# Altium footprint library Miscellaneous Connectors.PcbLib: 248 footprints (part 3 of 16)
Each footprint in its own frame and in the unit in brackets; x right, y up, seen from the top. Pads: shape width x height; smd on the part's side, far side on the other; paste and mask are expansions set on the pad; w line width, h text height; cw(c..) or ccw(c..) is an arc to the next point about the centre after c.
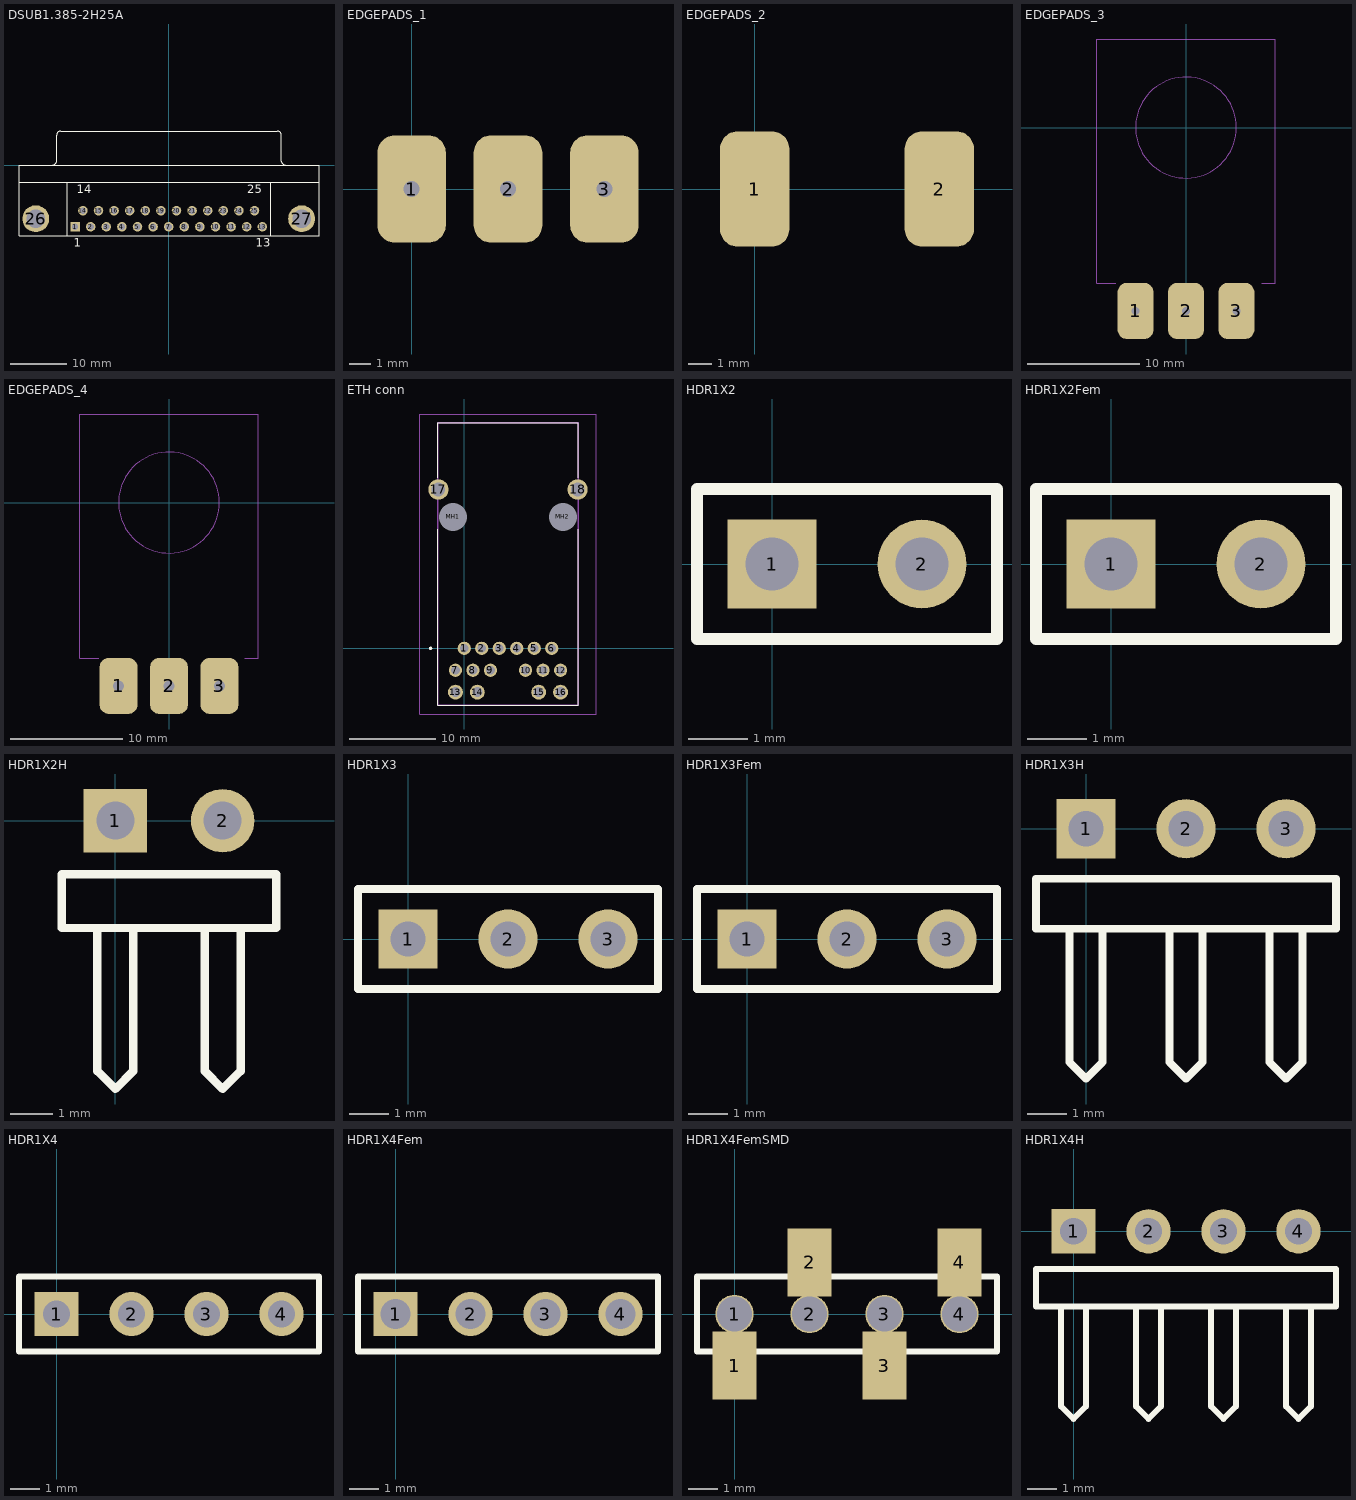
[diagram p2: the footprints below, top view; thin cyan lines are the x and y axes]

## DSUB1.385-2H25A [mm] "Connector; D Subminiature; 25 Position; Right Angle; Pitch 1.385 mm"
height 12.93
pads (27):
  rect 1.69x1.69 hole 1.09: 1(-16.566,-10.92)
  round 1.69 hole 1.09: 2(-13.805,-10.92) 3(-11.044,-10.92) 4(-8.283,-10.92) 5(-5.522,-10.92) 6(-2.761,-10.92) 7(0,-10.92) 8(2.761,-10.92) 9(5.522,-10.92) 10(8.283,-10.92) 11(11.044,-10.92) 12(13.805,-10.92) 13(16.566,-10.92) 14(-15.185,-8.08) 15(-12.424,-8.08) 16(-9.663,-8.08) 17(-6.902,-8.08) 18(-4.141,-8.08) 19(-1.38,-8.08) 20(1.381,-8.08) 21(4.142,-8.08) 22(6.903,-8.08) 23(9.664,-8.08) 24(12.425,-8.08) 25(15.186,-8.08)
  round 4.76 hole 3.26: 26(-23.526,-9.5) 27(23.526,-9.5)
Top Overlay:
  lines w0.2: -26.496,-3 26.604,-3 ; -20.541,0.005 ccw(c-20.541,0.7) -19.846,0.7 -19.846,5.3 ; -19.841,5.305 cw(c-19.146,5.305) -19.146,6 19.254,6 cw(c19.254,5.305) 19.949,5.305 ; -17.946,-12.5 -17.946,-3 ; 18.054,-12.5 18.054,-3 ; 19.954,5.3 19.954,0.7 ccw(c20.649,0.7) 20.649,0.005 ; -26.496,-12.5 -26.496,0 26.604,0 26.604,-12.5 -26.496,-12.5
  text "25" at 13.936,-4.975 h1.5
  text "14" at -16.31,-4.975 h1.5
  text "13" at 15.441,-14.475 h1.5
  text "1" at -16.816,-14.475 h1.5

## EDGEPADS_1 [mm] "Dim: 3x5. separacion: 5mm. Cantidad: 3"
pads (3):
  rrect50% 3.2x5 hole 0.75 square: 1(0,0) 2(4.5,0) 3(9,0)
3D body "pot 282TCCS104B25B3.STEP": height 23.23, standoff -5.57, extent -3.431,-25.9 12.469,2.7

## EDGEPADS_2 [mm] "Dim: 3x5. separacion: 8mm. Cantidad: 2"
pads (2):
  rrect50% 3x5 smd: 1(0,0) 2(8,0)

## EDGEPADS_3 [mm] "Dim: 3x5. separacion: 5mm. Cantidad: 3"
pads (3):
  rrect50% 3.2x5 hole 0.75 square: 1(-4.5,-16.35) 2(0,-16.35) 3(4.5,-16.35)
Mechanical 15:
  circle w0.1: c0,0 r4.5
  lines w0.1: -6.275,-13.9 -7.95,-13.9 -7.95,7.9 7.95,7.9 7.95,-13.9 6.75,-13.9
3D body "pot 282SCCF104B25A1.STEP": height 29.14, standoff -1.91, extent -11.4,-16.55 7.95,8.17

## EDGEPADS_4 [mm] "Dim: 3x5. separacion: 5mm. Cantidad: 3"
pads (3):
  rrect50% 3.4x5 hole 1 square: 1(-4.5,-16.35) 2(0,-16.35) 3(4.5,-16.35)
Mechanical 15:
  circle w0.1: c0,0 r4.5
  lines w0.1: -6.275,-13.9 -7.95,-13.9 -7.95,7.9 7.95,7.9 7.95,-13.9 6.75,-13.9
3D body "pot 282SAAF103A25B3.STEP": height 18.75, standoff -1.92, extent -7.95,-16.5 7.95,8.22

## ETH conn [mm]
pads (20):
  round 1.53 hole 1.02: 1(0,0) 2(2.03,0) 3(4.06,0) 4(6.09,0) 5(8.12,0) 6(10.15,0) 7(-1.015,-2.54) 8(1.015,-2.54) 9(3.045,-2.54) 10(7.105,-2.54) 11(9.135,-2.54) 12(11.165,-2.54)
  round 1.725 hole 1.15: 13(-1.02,-5.08) 14(1.52,-5.08) 15(8.63,-5.08) 16(11.17,-5.08)
  round 2.355 hole 1.57: 17(-2.99,18.41) 18(13.14,18.41)
  round 1.625 hole 3.25 unplated: MH1(-1.275,15.24) MH2(11.425,15.24)
Top Overlay:
  lines w0.1: -3.08,13.78 -3.08,-6.61 13.075,-6.61 13.23,-6.61 13.23,13.78 ; -3.08,19.78 -3.08,26.16 13.23,26.16 13.23,19.78
  lines w0.2: -3.9,-0.1 ccw(c-3.9,0) -3.9,0.1 ccw(c-3.9,0) -3.9,-0.1
Mechanical 13:
  lines w0.2: -3.08,-6.61 -3.08,26.16 13.23,26.16 13.23,-6.61 -3.08,-6.61
Mechanical 15:
  lines w0.1: -5.168,-7.61 -5.168,27.16 15.317,27.16 15.317,-7.61 -5.168,-7.61
3D body "0826-1K1T-43-F.stp": height 13.71, standoff -5, extent -3.67,-6.61 13.825,26.16

## HDR1X2 [mm] "Connector; Header; 2 Position"
pads (2):
  rect 1.5x1.5 hole 0.9: 1(0,0)
  round 1.5 hole 0.9: 2(2.54,0)
Top Overlay:
  lines w0.2: -1.27,-1.27 -1.27,1.27 3.81,1.27 3.81,-1.27 -1.27,-1.27
3D body "pin1x2.STEP": height 8.49, standoff -2.49, extent -1.265,-1.265 3.815,1.275

## HDR1X2Fem [mm] "Connector; Header Female; 2 Position"
pads (2):
  rect 1.5x1.5 hole 0.9: 1(0,0)
  round 1.5 hole 0.9: 2(2.54,0)
Top Overlay:
  lines w0.2: -1.27,-1.27 -1.27,1.27 3.81,1.27 3.81,-1.27 -1.27,-1.27

## HDR1X2H [mm] "Connector; Header; 2 Position; Right Angle"
pads (2):
  rect 1.5x1.5 hole 0.9: 1(0,0)
  round 1.5 hole 0.9: 2(2.54,0)
Top Overlay:
  lines w0.2: -0.423,-2.54 -0.423,-5.927 0,-6.35 0.423,-5.927 0.423,-2.54 ; 2.117,-2.54 2.117,-5.927 2.54,-6.35 2.963,-5.927 2.963,-2.54 ; -1.27,-2.54 -1.27,-1.27 3.81,-1.27 3.81,-2.54 -1.27,-2.54

## HDR1X3 [mm] "Connector; Header; 3 Position"
pads (3):
  rect 1.5x1.5 hole 0.9: 1(0,0)
  round 1.5 hole 0.9: 2(2.54,0) 3(5.08,0)
Top Overlay:
  lines w0.2: -1.27,-1.27 -1.27,1.27 6.35,1.27 6.35,-1.27 -1.27,-1.27
3D body "pin1x3.step": height 9.5, standoff -3.2, extent -1.26,-1.215 6.36,1.325

## HDR1X3Fem [mm] "Connector; Header Female; 3 Position"
pads (3):
  rect 1.5x1.5 hole 0.9: 1(0,0)
  round 1.5 hole 0.9: 2(2.54,0) 3(5.08,0)
Top Overlay:
  lines w0.2: -1.27,-1.27 6.35,-1.27 6.35,1.27 -1.27,1.27 -1.27,-1.27

## HDR1X3H [mm] "Connector; Header; 3 Position; Right Angle"
pads (3):
  rect 1.5x1.5 hole 0.9: 1(0,0)
  round 1.5 hole 0.9: 2(2.54,0) 3(5.08,0)
Top Overlay:
  lines w0.2: -0.423,-2.54 -0.423,-5.927 0,-6.35 0.423,-5.927 0.423,-2.54 ; 2.117,-2.54 2.117,-5.927 2.54,-6.35 2.963,-5.927 2.963,-2.54 ; 4.657,-2.54 4.657,-5.927 5.08,-6.35 5.503,-5.927 5.503,-2.54 ; -1.27,-2.54 -1.27,-1.27 6.35,-1.27 6.35,-2.54 -1.27,-2.54

## HDR1X4 [mm] "Connector; Header; 4 Position"
pads (4):
  rect 1.5x1.5 hole 0.9: 1(0,0)
  round 1.5 hole 0.9: 2(2.54,0) 3(5.08,0) 4(7.62,0)
Top Overlay:
  lines w0.2: -1.27,-1.27 8.89,-1.27 8.89,1.27 -1.27,1.27 -1.27,-1.27
3D body "pin1x4.STEP": height 8.51, standoff -3.68, extent -1.291,-1.501 8.869,1.419

## HDR1X4Fem [mm] "Connector; Header Female; 4 Position"
pads (4):
  rect 1.5x1.5 hole 1: 1(0,0)
  round 1.5 hole 1: 2(2.54,0) 3(5.08,0) 4(7.62,0)
Top Overlay:
  lines w0.2: -1.27,-1.27 8.89,-1.27 8.89,1.27 -1.27,1.27 -1.27,-1.27

## HDR1X4FemSMD [mm] "Connector; Header Female; 4 Position"
pads (8):
  rect 1.5x2.3 smd: 1(0,-1.75) 2(2.54,1.75) 3(5.08,-1.75) 4(7.62,1.75)
  round 1.3 hole 1.2: 1(0,0) 2(2.54,0) 3(5.08,0) 4(7.62,0)
Top Overlay:
  lines w0.2: -1.27,-1.27 8.89,-1.27 8.89,1.27 -1.27,1.27 -1.27,-1.27
3D body "header female 1x4 SMD.STEP": height 6.55, standoff 0, extent -1.397,-2.208 9.023,1.954

## HDR1X4H [mm] "Connector; Header; 4 Position; Right Angle"
pads (4):
  rect 1.5x1.5 hole 0.9: 1(0,0)
  round 1.5 hole 0.9: 2(2.54,0) 3(5.08,0) 4(7.62,0)
Top Overlay:
  lines w0.2: -0.423,-2.54 -0.423,-5.927 0,-6.35 0.423,-5.927 0.423,-2.54 ; 2.117,-2.54 2.117,-5.927 2.54,-6.35 2.963,-5.927 2.963,-2.54 ; 4.657,-2.54 4.657,-5.927 5.08,-6.35 5.503,-5.927 5.503,-2.54 ; 7.197,-2.54 7.197,-5.927 7.62,-6.35 8.043,-5.927 8.043,-2.54 ; -1.27,-2.54 8.89,-2.54 8.89,-1.27 -1.27,-1.27 -1.27,-2.54